# Altium footprint library Capacitor.PcbLib: 119 footprints (part 7 of 8)
Each footprint in its own frame and in the unit in brackets; x right, y up, seen from the top. Pads: shape width x height; smd on the part's side, far side on the other; paste and mask are expansions set on the pad; w line width, h text height; cw(c..) or ccw(c..) is an arc to the next point about the centre after c.
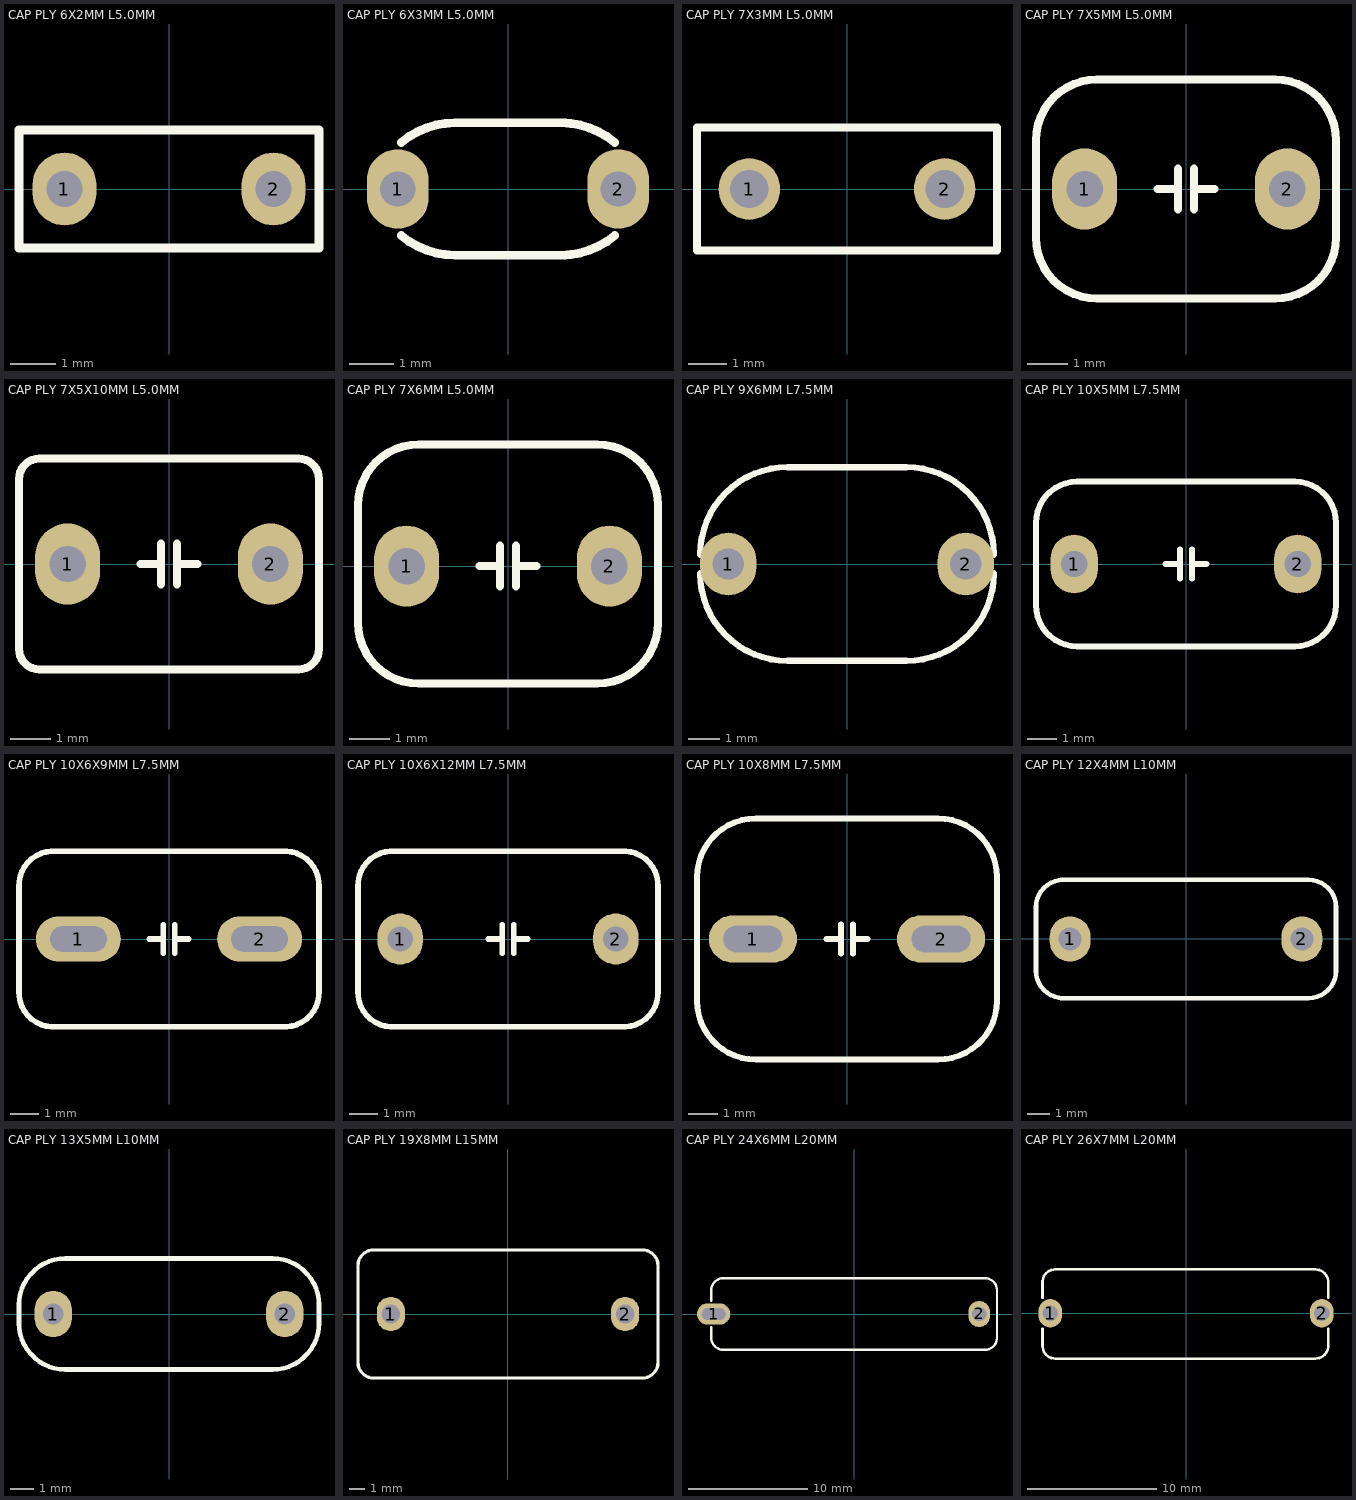
[diagram p6: the footprints below, top view; thin cyan lines are the x and y axes]

## CAP PLY 6X2MM L5.0MM [mm] "CAP, FILM MKT, 6.3X2.4mm, pitch: 4.7mm"
height 6.5
pads (2):
  oval 1.4x1.6 hole 0.8 mask+0.075: 1(-2.3,0) 2(2.3,0)
Top Overlay:
  lines w0.2: -3.3,-1.3 3.3,-1.3 3.3,1.3 -3.3,1.3 -3.3,-1.3
3D body "cap.STEP": height 6.34, standoff -1.96, extent -3.15,-1.2 3.15,1.2

## CAP PLY 6X3MM L5.0MM [mm] "CAP, POLYESTER, 5.8X3.5mm pitch: 5.0mm"
pads (2):
  oval 1.4x1.8 hole 0.8: 1(-2.5,0) 2(2.5,0)
Top Overlay:
  lines w0.2: -2.421,-1.055 ccw(c-1.2,0.4) -1.2,-1.5 1.3,-1.5 ; -2.421,1.055 cw(c-1.2,-0.4) -1.2,1.5 1.3,1.5 ; 1.2,-1.5 ccw(c1.2,0.4) 2.421,-1.055 ; 1.2,1.5 cw(c1.2,-0.4) 2.421,1.055
3D body "CAP 6mm Adasi.STEP": height 8.5, standoff -25.12, extent -2.95,-1.9 3.05,1.9

## CAP PLY 7X3MM L5.0MM [mm] "CAP, POLYESTER, 7.5X3mm pitch: 5.0mm"
pads (2):
  round 1.6 / inner round 1.6 / far side oval 1.6x2.4 hole 1: 1(-2.54,0) 2(2.54,0)
Top Overlay:
  lines w0.2: -3.9,-1.6 -3.9,1.6 3.9,1.6 3.9,-1.6 -3.9,-1.6
3D body "User Library-100n.step": height 7.6, standoff -4.6, extent -3.75,-1.25 3.75,1.25

## CAP PLY 7X5MM L5.0MM [mm] "CAP, POLYESTER, 7.0X5.0mm pitch: 5.0mm"
height 7
pads (2):
  oval 1.6x2 hole 0.9: 1(-2.5,0) 2(2.5,0)
Top Overlay:
  lines w0.2: -0.7,0 -0.2,0 ; -0.2,-0.5 -0.2,0.5 ; 0.2,-0.5 0.2,0.5 ; 0.2,0 0.7,0 ; -3.7,-1.2 ccw(c-2.2,-1.2) -2.2,-2.7 2.2,-2.7 ccw(c2.2,-1.2) 3.7,-1.2 3.7,1.2 ccw(c2.2,1.2) 2.2,2.7 -2.2,2.7 ccw(c-2.2,1.2) -3.7,1.2 -3.7,-1.2
3D body "Cap, film, 7.3x5.2x7x5LS.STP": height 8, standoff -2, extent -3.65,-2.6 3.65,2.6

## CAP PLY 7X5X10MM L5.0MM [mm] "CAP, POLYESTER, 7.0X5.0x10mm pitch: 5.0mm"
height 7
pads (2):
  oval 1.6x2 hole 0.9: 1(-2.5,0) 2(2.5,0)
Top Overlay:
  lines w0.2: -0.7,0 -0.2,0 ; -0.2,-0.5 -0.2,0.5 ; 0.2,-0.5 0.2,0.5 ; 0.2,0 0.7,0 ; -3.7,-2.1 ccw(c-3.2,-2.1) -3.2,-2.6 3.2,-2.6 ccw(c3.2,-2.1) 3.7,-2.1 3.7,2.1 ccw(c3.2,2.1) 3.2,2.6 -3.2,2.6 ccw(c-3.2,2.1) -3.7,2.1 -3.7,-2.1
3D body "User Library-WIMA Capacitor_RM5-7.2X5X10.step": height 10, standoff -2.5, extent -3.6,-2.5 3.6,2.5

## CAP PLY 7X6MM L5.0MM [mm] "CAP, POLYESTER, 7.0X6.0mm pitch: 5.0mm"
height 7
pads (2):
  oval 1.6x2 hole 0.9: 1(-2.5,0) 2(2.5,0)
Top Overlay:
  lines w0.2: -0.7,0 -0.2,0 ; -0.2,-0.5 -0.2,0.5 ; 0.2,-0.5 0.2,0.5 ; 0.2,0 0.7,0 ; -3.7,-1.4 ccw(c-2.2,-1.4) -2.2,-2.9 2.2,-2.9 ccw(c2.2,-1.4) 3.7,-1.4 3.7,1.5 ccw(c2.2,1.5) 2.2,3 -2.2,3 ccw(c-2.2,1.5) -3.7,1.5 -3.7,-1.4
3D body "Cap, film, 7.3x5.7x7.3x5LS.STP": height 8.3, standoff -2, extent -3.65,-2.85 3.65,2.85

## CAP PLY 9X6MM L7.5MM [mm] "CAP, POLYESTER, 9.3X5.2mm pitch: 7.6mm"
pads (2):
  oval 1.8x2 hole 1: 1(-3.8,0) 2(3.8,0)
Top Overlay:
  lines w0.2: -4.7,-0.3 ccw(c-1.9,-0.3) -1.9,-3.1 1.9,-3.1 ccw(c1.9,-0.3) 4.7,-0.3 ; -4.7,0.3 cw(c-1.9,0.3) -1.9,3.1 1.9,3.1 cw(c1.9,0.3) 4.7,0.3
3D body "Cap 100n - 400V Poly.STEP": height 11.68, standoff -2.24, extent -4.585,-2.931 4.686,2.988

## CAP PLY 10X5MM L7.5MM [mm] "CAP, POLYESTER, 10X5.5mm pitch: 7.6mm"
height 9
pads (2):
  oval 1.6x2 hole 0.9 unplated mask+0.075: 1(-3.8,0) 2(3.8,0)
Top Overlay:
  lines w0.2: -0.7,0 -0.2,0 ; -0.2,-0.5 -0.2,0.5 ; 0.2,-0.5 0.2,0.5 ; 0.2,0 0.7,0 ; -5.1,-1.4 ccw(c-3.7,-1.4) -3.7,-2.8 3.7,-2.8 ccw(c3.7,-1.4) 5.1,-1.4 5.1,1.4 ccw(c3.7,1.4) 3.7,2.8 -3.7,2.8 ccw(c-3.7,1.4) -5.1,1.4 -5.1,-1.4
3D body "CAPF_5.5x9.0x10.0 TxHxW 7.5mmLS.STEP": height 9, standoff -2.54, extent -5,-2.75 5,2.75

## CAP PLY 10X6X9MM L7.5MM [mm] "CAP, POLYESTER, 10.5X6.0X9.0mm pitch: 7.6mm"
height 9
pads (2):
  oval 3x1.6 hole 0.9 slot 2 at 0 deg unplated mask+0.075: 1(-3.2,0) 2(3.2,0)
Top Overlay:
  lines w0.2: -0.7,0 -0.2,0 ; -0.2,-0.5 -0.2,0.5 ; 0.2,-0.5 0.2,0.5 ; 0.2,0 0.7,0 ; -5.299,-1.843 ccw(c-4.1,-1.9) -4.157,-3.099 4.157,-3.099 ccw(c4.1,-1.9) 5.299,-1.843 5.299,1.843 ccw(c4.1,1.9) 4.157,3.099 -4.157,3.099 ccw(c-4.1,1.9) -5.299,1.843 -5.299,-1.843
3D body "CAPF_6.0x9.0x10.5 TxHxW 7.5mmLS.STEP": height 9, standoff -2.54, extent -5.25,-3 5.25,3

## CAP PLY 10X6X12MM L7.5MM [mm] "CAP, POLYESTER, 10.3X6.0X12.0mm pitch: 7.6mm"
height 6
pads (2):
  oval 1.6x1.8 hole 0.9 unplated: 1(-3.81,0) 2(3.81,0)
Top Overlay:
  lines w0.2: -0.7,0 -0.2,0 ; -0.2,-0.5 -0.2,0.5 ; 0.2,-0.5 0.2,0.5 ; 0.2,0 0.7,0 ; -5.299,-1.843 ccw(c-4.1,-1.9) -4.157,-3.099 4.157,-3.099 ccw(c4.1,-1.9) 5.299,-1.843 5.299,1.843 ccw(c4.1,1.9) 4.157,3.099 -4.157,3.099 ccw(c-4.1,1.9) -5.299,1.843 -5.299,-1.843
3D body "CAPMF_10.3x6.0x13.0mm WxTxH 7.5mmLS.STEP": height 13, standoff -2.54, extent -5.15,-3 5.15,3

## CAP PLY 10X8MM L7.5MM [mm] "CAP, POLYESTER, 10.0X8.0 pitch: 7.6mm"
height 10
pads (2):
  oval 3x1.6 hole 0.9 slot 2 at 0 deg unplated mask+0.075: 1(-3.2,0) 2(3.2,0)
Top Overlay:
  lines w0.2: -0.7,0 -0.2,0 ; -0.2,-0.5 -0.2,0.5 ; 0.2,-0.5 0.2,0.5 ; 0.2,0 0.7,0 ; -5.1,-2.1 ccw(c-3.1,-2.1) -3.1,-4.1 3.1,-4.1 ccw(c3.1,-2.1) 5.1,-2.1 5.1,2.1 ccw(c3.1,2.1) 3.1,4.1 -3.1,4.1 ccw(c-3.1,2.1) -5.1,2.1 -5.1,-2.1
3D body "mfcap_7.5mm 10x8x11mm.stp": height 11, standoff -2.54, extent -5,-4 5,4

## CAP PLY 12X4MM L10MM [mm] "CAP, POLYESTER, 12.5X4.5X9.0 pitch: 10mm"
height 9
pads (2):
  oval 1.8x2 hole 1: 1(-5.1,0) 2(5.1,0)
Top Overlay:
  lines w0.2: -5.5,-2.6 5.4,-2.6 ccw(c5.4,-1.4) 6.6,-1.4 6.6,1.4 ccw(c5.4,1.4) 5.4,2.6 -5.5,2.6 ; -5.4,-2.6 cw(c-5.4,-1.4) -6.6,-1.4 -6.6,1.4 cw(c-5.4,1.4) -5.4,2.6
3D body "User Library-Capacitor MKT_B32591C3104 (Pitch 10mm).step": height 12.5, standoff -6, extent -6.5,-2.5 6.5,2.5

## CAP PLY 13X5MM L10MM [mm] "CAP, POLYESTER, 12.8X4.8 pitch: 10mm"
pads (2):
  oval 1.6x2 hole 0.9: 1(-5,0) 2(5,0)
Top Overlay:
  lines w0.2: -6.48,-0.4 ccw(c-4.48,-0.4) -4.48,-2.4 4.48,-2.4 ccw(c4.48,-0.4) 6.48,-0.4 6.48,0.4 ccw(c4.48,0.4) 4.48,2.4 -4.48,2.4 ccw(c-4.48,0.4) -6.48,0.4 -6.48,-0.4
3D body "Cap 10n - 630V Poly_2009.STEP": height 12.19, standoff -1.73, extent -6.375,-2.401 6.375,2.35

## CAP PLY 19X8MM L15MM [mm] "CAP, POLYESTER, 19.0X8.0mm pitch: 15.0mm, 0.22uF 400V"
pads (2):
  oval 1.8x2.2 hole 1.2: 1(-7.5,0) 2(7.5,0)
Top Overlay:
  lines w0.2: -9.6,-3.1 ccw(c-8.6,-3.1) -8.6,-4.1 8.6,-4.1 ccw(c8.6,-3.1) 9.6,-3.1 9.6,3.1 ccw(c8.6,3.1) 8.6,4.1 -8.6,4.1 ccw(c-8.6,3.1) -9.6,3.1 -9.6,-3.1
3D body "User Library-CAP_POLY_15mm.step": height 16, standoff -4, extent -9.5,-4 9.5,4

## CAP PLY 24X6MM L20MM [mm] "CAP, POLYESTER, 23.8X5.8mm pitch: 20.0mm, 0.33uF 400V"
pads (2):
  oval 2.8x1.8 hole 1 slot 2 at 0 deg: 1(-11.8,0)
  oval 1.8x2.2 hole 1.2: 2(10.5,0)
Top Overlay:
  lines w0.2: -12,-2.1 -12,-1.1 ; -12,-2 ccw(c-11,-2) -11,-3 11,-3 ccw(c11,-2) 12,-2 12,2.1 ; -12,1.1 -12,2.1 ; -12,2 cw(c-11,2) -11,3 11,3 cw(c11,2) 12,2
3D body "Cap 330n - 400V Poly_2009.STEP": height 10.92, standoff -3, extent -11.888,-2.85 11.862,2.901

## CAP PLY 26X7MM L20MM [mm] "CAP, POLYESTER, 26.0X7.0mm pitch: 20.0mm, 0.68uF 400V"
pads (2):
  oval 1.8x2.2 hole 1.2: 1(-10.5,0) 2(10.5,0)
Top Overlay:
  lines w0.2: -11.1,-1.2 -11.1,-2.5 ccw(c-10.1,-2.5) -10.1,-3.5 10,-3.5 ccw(c10,-2.5) 11,-2.5 11,-1.2 ; -11.1,1.2 -11.1,2.5 ; -11.1,2.4 cw(c-10.1,2.4) -10.1,3.4 10,3.4 cw(c10,2.4) 11,2.4 ; 11,1.2 11,2.5
3D body "User Library-ECQE(F) 0_33uf 630Vdc 250Vac.step": height 19, standoff -3, extent -13,-3.9 13,3.9